# Altium footprint library PcbLib1.PcbLib: 81 footprints (part 2 of 6)
Each footprint in its own frame and in the unit in brackets; x right, y up, seen from the top. Pads: shape width x height; smd on the part's side, far side on the other; paste and mask are expansions set on the pad; w line width, h text height; cw(c..) or ccw(c..) is an arc to the next point about the centre after c.
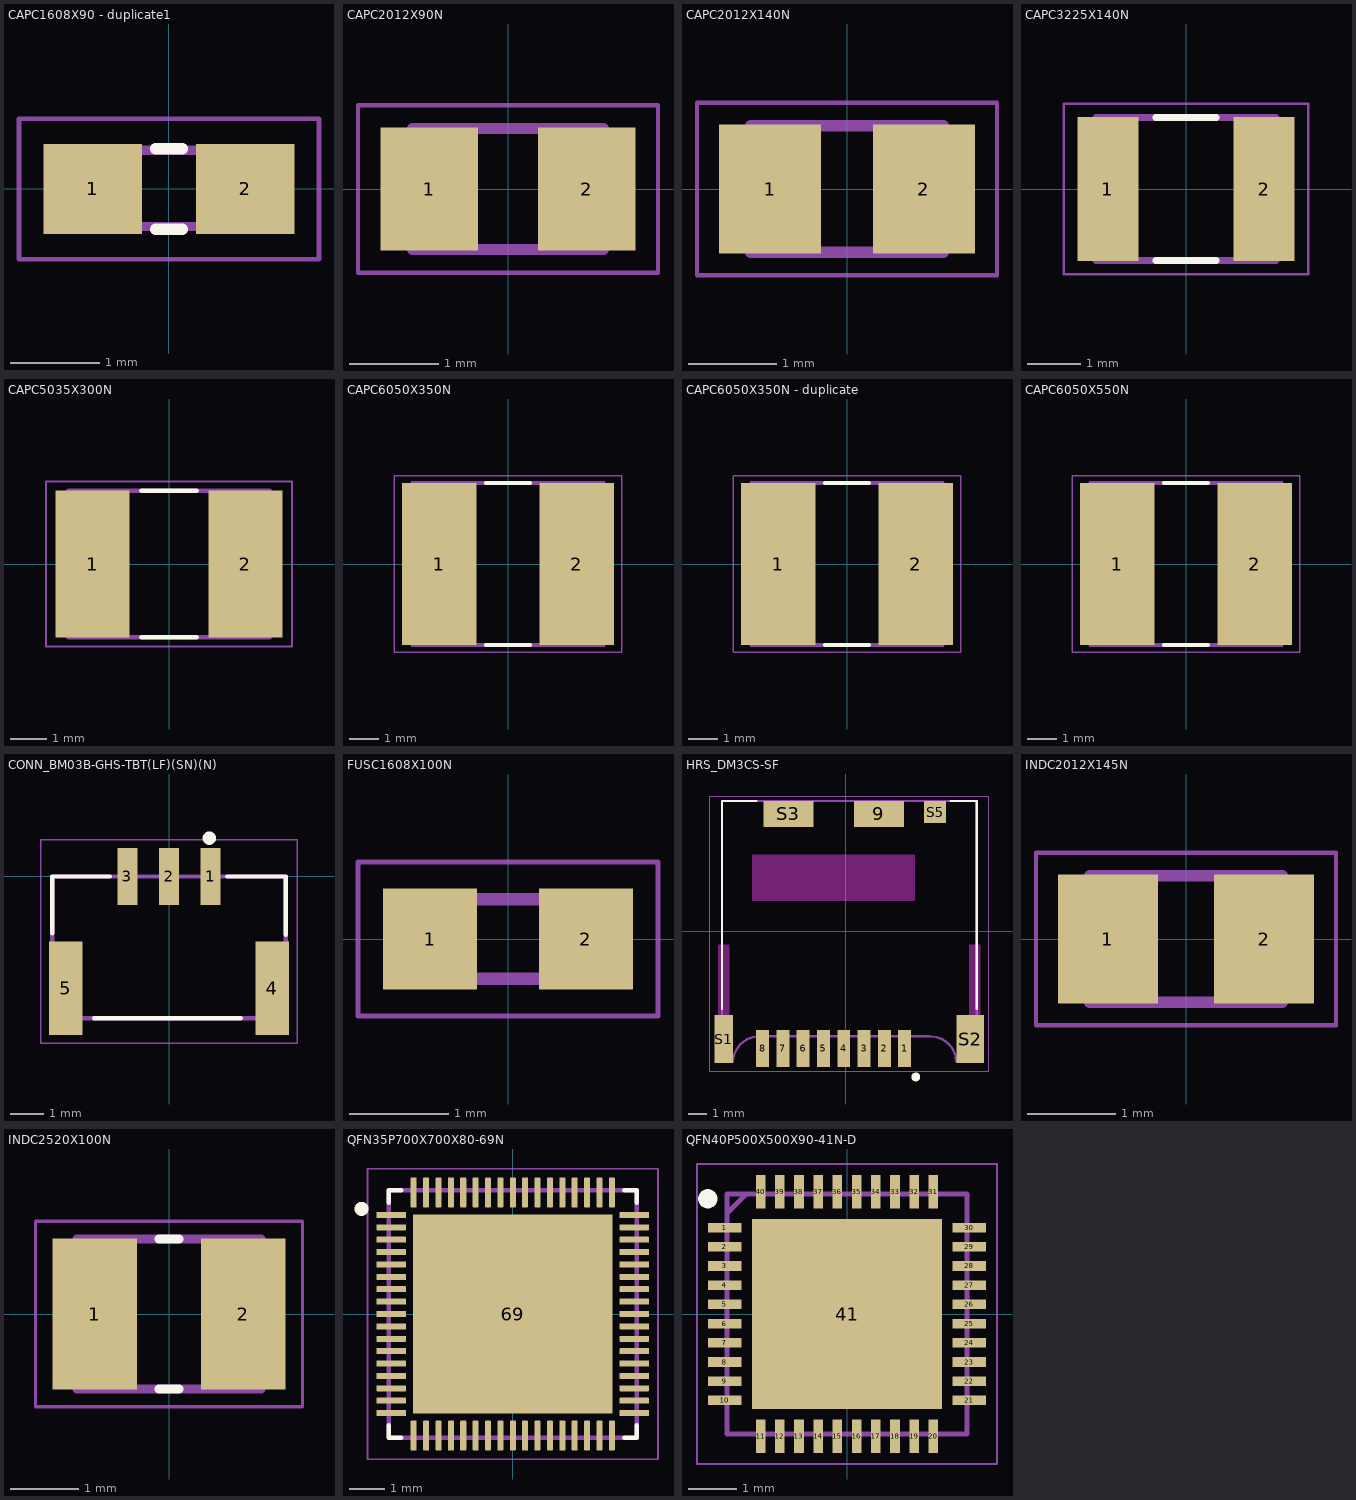
[diagram p1: the footprints below, top view; thin cyan lines are the x and y axes]

## CAPC1608X90 - duplicate1 [mm]
pads (2):
  rect 1.1x1 smd paste+0 mask+0.102: 1(-0.85,0) 2(0.85,0)
Top Overlay:
  lines w0.127: -0.15,-0.45 0.15,-0.45 ; -0.15,0.45 0.15,0.45
Mechanical 13:
  region: 0.83,-0.471 0.331,-0.471 0.331,0.48 0.83,0.48
  region: -0.338,-0.47 -0.839,-0.47 -0.839,0.48 -0.338,0.48
  lines w0.102: -0.356,-0.419 0.356,-0.419 ; -0.356,0.432 0.356,0.432
Mechanical 15:
  lines w0.051: -1.673,-0.783 -1.673,0.783 1.673,0.783 1.673,-0.783 -1.673,-0.783
3D body "step_temp.STEP": height 0.9, standoff 0, extent -0.8,-0.4 0.8,0.4

## CAPC2012X90N [mm]
pads (2):
  rect 1.1x1.38 smd: 1(-0.885,0) 2(0.885,0)
Mechanical 13:
  lines w0.127: -1.07,-0.68 -1.07,0.68 1.07,0.68 1.07,-0.68 -1.07,-0.68
Mechanical 15:
  lines w0.05: -1.685,-0.94 -1.685,0.94 1.685,0.94 1.685,-0.94 -1.685,-0.94
3D body "step_temp.STEP": height 0.9, standoff 0, extent -1,-0.625 1,0.625

## CAPC2012X140N [mm]
pads (2):
  rect 1.16x1.47 smd: 1(-0.875,0) 2(0.875,0)
Mechanical 13:
  lines w0.127: -1.1,-0.72 -1.1,0.72 1.1,0.72 1.1,-0.72 -1.1,-0.72
Mechanical 15:
  lines w0.05: -1.708,-0.983 -1.708,0.983 1.708,0.983 1.708,-0.983 -1.708,-0.983
3D body "step_temp.STEP": height 1.4, standoff 0, extent -1.016,-0.635 1.016,0.635

## CAPC3225X140N [mm]
pads (2):
  rect 1.16x2.72 smd: 1(-1.475,0) 2(1.475,0)
Top Overlay:
  lines w0.127: -0.57,-1.35 0.57,-1.35 ; -0.57,1.35 0.57,1.35
Mechanical 13:
  lines w0.127: -1.7,-1.35 1.7,-1.35 1.7,1.35 -1.7,1.35 -1.7,-1.35
Mechanical 15:
  lines w0.05: -2.308,-1.608 2.308,-1.608 2.308,1.608 -2.308,1.608 -2.308,-1.608
3D body "step_temp.STEP": height 1.45, standoff 0, extent -1.6,-1.25 1.6,1.25

## CAPC5035X300N [mm]
pads (2):
  rect 2.03x4.01 smd: 1(-2.086,0) 2(2.086,0)
Top Overlay:
  lines w0.127: -0.75,-2 0.75,-2 ; -0.75,2 0.75,2
Mechanical 13:
  lines w0.127: -2.75,-2 -2.75,2 2.75,2 2.75,-2 -2.75,-2
Mechanical 15:
  lines w0.05: -3.353,-2.253 -3.353,2.253 3.353,2.253 3.353,-2.253 -3.353,-2.253
3D body "step_temp.STEP": height 3, standoff 0, extent -2.5,-1.75 2.5,1.75

## CAPC6050X350N [mm]
pads (2):
  rect 2.53x5.51 smd: 1(-2.336,0) 2(2.336,0)
Top Overlay:
  lines w0.127: -0.75,-2.75 0.75,-2.75 ; -0.75,2.75 0.75,2.75
Mechanical 13:
  lines w0.127: -3.25,-2.75 3.25,-2.75 3.25,2.75 -3.25,2.75 -3.25,-2.75
Mechanical 15:
  lines w0.05: -3.853,-3.003 3.853,-3.003 3.853,3.003 -3.853,3.003 -3.853,-3.003
3D body "step_temp.STEP": height 3.5, standoff 0, extent -3,-2.5 3,2.5

## CAPC6050X350N - duplicate [mm]
pads (2):
  rect 2.53x5.51 smd: 1(-2.336,0) 2(2.336,0)
Top Overlay:
  lines w0.127: -0.75,-2.75 0.75,-2.75 ; -0.75,2.75 0.75,2.75
Mechanical 13:
  lines w0.127: -3.25,-2.75 -3.25,2.75 3.25,2.75 3.25,-2.75 -3.25,-2.75
Mechanical 15:
  lines w0.05: -3.853,-3.003 -3.853,3.003 3.853,3.003 3.853,-3.003 -3.853,-3.003
3D body "step_temp.STEP": height 3.5, standoff 0, extent -3,-2.5 3,2.5

## CAPC6050X550N [mm]
pads (2):
  rect 2.53x5.51 smd: 1(-2.336,0) 2(2.336,0)
Top Overlay:
  lines w0.127: -0.75,-2.75 0.75,-2.75 ; -0.75,2.75 0.75,2.75
Mechanical 13:
  lines w0.127: -3.25,-2.75 -3.25,2.75 3.25,2.75 3.25,-2.75 -3.25,-2.75
Mechanical 15:
  lines w0.05: -3.853,-3.003 -3.853,3.003 3.853,3.003 3.853,-3.003 -3.853,-3.003
3D body "step_temp.STEP": height 5.5, standoff 0, extent -3,-2.5 3,2.5

## CONN_BM03B-GHS-TBT(LF)(SN)(N) [mm]
pads (5):
  rect 0.6x1.7 smd: 1(1.25,0) 2(0,0) 3(-1.25,0)
  rect 1x2.8 smd: 4(3.1,-3.35) 5(-3.1,-3.35)
Top Overlay:
  circle w0.2: c1.21,1.15 r0.1
  lines w0.127: -3.5,-1.7 -3.5,0 -1.778,0 ; -2.25,-4.25 2.15,-4.25 ; 1.75,0 3.5,0 3.5,-1.75
Mechanical 13:
  lines w0.127: -3.5,-4.25 -3.5,0 3.5,0 3.5,-4.25 -3.5,-4.25
Mechanical 15:
  lines w0.05: -3.85,-5 -3.85,1.1 3.85,1.1 3.85,-5 -3.85,-5
3D body "step_temp.STEP": height 4.05, standoff -0.15, extent -3.5,-4.411 3.5,0.539

## FUSC1608X100N [mm]
height 1
pads (2):
  rect 0.95x1.02 smd: 1(-0.785,0) 2(0.785,0)
Mechanical 13:
  lines w0.127: -0.8,-0.4 -0.8,0.4 0.8,0.4 0.8,-0.4 -0.8,-0.4
Mechanical 15:
  lines w0.05: -1.51,-0.775 -1.51,0.775 1.51,0.775 1.51,-0.775 -1.51,-0.775
3D body "step_temp.STEP": height 1, standoff 0, extent -0.8,-0.4 0.8,0.4

## HRS_DM3CS-SF [mm]
pads (13):
  rect 0.7x2 smd: 1(3.2,-6.35) 2(2.1,-6.35) 3(1,-6.35) 4(-0.1,-6.35) 5(-1.2,-6.35) 6(-2.3,-6.35) 7(-3.4,-6.35) 8(-4.5,-6.35)
  rect 2.7x1.4 smd: 9(1.8,6.35) S3(-3.1,6.35)
  rect 1x2.6 smd: S1(-6.6,-5.85)
  rect 1.5x2.6 smd: S2(6.75,-5.85)
  rect 1.2x1.2 smd: S5(4.85,6.45)
Top Overlay:
  circle w0.24: c3.8,-7.9 r0.12
  lines w0.127: -6.7,-4.2 -6.7,7.05 -4.826,7.05 ; 5.7,7.05 7.1,7.05 7.1,-4.2
Keep-Out Layer:
  region: 3.75,1.651 -5.053,1.651 -5.053,4.15 3.75,4.15
  region: -6.3,-4.558 -6.912,-4.558 -6.912,-0.75 -6.3,-0.75
  region: 7.3,-4.556 6.709,-4.556 6.709,-0.75 7.3,-0.75
Mechanical 13:
  lines w0.127: 4.5,-5.7 -4.6,-5.7 ccw(c-4.675,-7.125) -6.1,-7.05 -6.7,-7.05 -6.7,7.05 7.1,7.05 7.1,-7.05 6,-7.05 ccw(c4.575,-7.125) 4.5,-5.7
Mechanical 15:
  lines w0.05: -7.35,-7.6 -7.35,7.3 7.75,7.3 7.75,-7.6 -7.35,-7.6
3D body "step_temp.STEP": height 2.13, standoff 0, extent -6.9,-7.05 6.9,7.05

## INDC2012X145N [mm]
pads (2):
  rect 1.14x1.47 smd paste+0 mask+0.102: 1(-0.89,0) 2(0.89,0)
Mechanical 13:
  lines w0.127: -1.1,-0.72 -1.1,0.72 1.1,0.72 1.1,-0.72 -1.1,-0.72
Mechanical 15:
  lines w0.05: -1.708,-0.983 -1.708,0.983 1.708,0.983 1.708,-0.983 -1.708,-0.983
3D body "step_temp.STEP": height 1.45, standoff 0, extent -1,-0.625 1,0.625

## INDC2520X100N [mm]
pads (2):
  rect 1.24x2.22 smd: 1(-1.09,0) 2(1.09,0)
Top Overlay:
  lines w0.127: -0.15,-1.1 0.15,-1.1 ; -0.15,1.1 0.15,1.1
Mechanical 13:
  lines w0.127: -1.35,-1.1 1.35,-1.1 1.35,1.1 -1.35,1.1 -1.35,-1.1
Mechanical 15:
  lines w0.05: -1.958,-1.358 1.958,-1.358 1.958,1.358 -1.958,1.358 -1.958,-1.358
3D body "DFE252010P-R47M=P2.STEP": height 1, standoff 0, extent -1.25,-1 1.25,1

## PCBComponent_1 [mm]

## QFN35P700X700X80-69N [mm]
pads (69):
  rrect25% 0.84x0.17 smd: 1(-3.435,2.8) 2(-3.435,2.45) 3(-3.435,2.1) 4(-3.435,1.75) 5(-3.435,1.4) 6(-3.435,1.05) 7(-3.435,0.7) 8(-3.435,0.35) 9(-3.435,0) 10(-3.435,-0.35) 11(-3.435,-0.7) 12(-3.435,-1.05) 13(-3.435,-1.4) 14(-3.435,-1.75) 15(-3.435,-2.1) 16(-3.435,-2.45) 17(-3.435,-2.8) 35(3.435,-2.8) 36(3.435,-2.45) 37(3.435,-2.1) 38(3.435,-1.75) 39(3.435,-1.4) 40(3.435,-1.05) 41(3.435,-0.7) 42(3.435,-0.35) 43(3.435,0) 44(3.435,0.35) 45(3.435,0.7) 46(3.435,1.05) 47(3.435,1.4) 48(3.435,1.75) 49(3.435,2.1) 50(3.435,2.45) 51(3.435,2.8)
  rrect25% 0.17x0.84 smd: 18(-2.8,-3.435) 19(-2.45,-3.435) 20(-2.1,-3.435) 21(-1.75,-3.435) 22(-1.4,-3.435) 23(-1.05,-3.435) 24(-0.7,-3.435) 25(-0.35,-3.435) 26(0,-3.435) 27(0.35,-3.435) 28(0.7,-3.435) 29(1.05,-3.435) 30(1.4,-3.435) 31(1.75,-3.435) 32(2.1,-3.435) 33(2.45,-3.435) 34(2.8,-3.435) 52(2.8,3.435) 53(2.45,3.435) 54(2.1,3.435) 55(1.75,3.435) 56(1.4,3.435) 57(1.05,3.435) 58(0.7,3.435) 59(0.35,3.435) 60(0,3.435) 61(-0.35,3.435) 62(-0.7,3.435) 63(-1.05,3.435) 64(-1.4,3.435) 65(-1.75,3.435) 66(-2.1,3.435) 67(-2.45,3.435) 68(-2.8,3.435)
  rect 5.63x5.63 smd paste-1.406: 69(0,0)
Top Overlay:
  circle w0.2: c-4.275,2.97 r0.1
  lines w0.127: -3.5,-3.15 -3.5,-3.5 -3.15,-3.5 ; -3.5,3.15 -3.5,3.5 -3.15,3.5 ; 3.15,-3.5 3.5,-3.5 3.5,-3.15 ; 3.15,3.5 3.5,3.5 3.5,3.15
Mechanical 13:
  lines w0.127: -3.5,-3.5 -3.5,3.5 3.5,3.5 3.5,-3.5 -3.5,-3.5
Mechanical 15:
  lines w0.05: -4.105,-4.105 -4.105,4.105 4.105,4.105 4.105,-4.105 -4.105,-4.105
3D body "step_temp.STEP": height 0.8, standoff 0, extent -3.5,-3.5 3.5,3.5

## QFN40P500X500X90-41N-D [mm]
pads (41):
  rect 0.7x0.2 smd: 1(-2.55,1.8) 2(-2.55,1.4) 3(-2.55,1) 4(-2.55,0.6) 5(-2.55,0.2) 6(-2.55,-0.2) 7(-2.55,-0.6) 8(-2.55,-1) 9(-2.55,-1.4) 10(-2.55,-1.8) 21(2.55,-1.8) 22(2.55,-1.4) 23(2.55,-1) 24(2.55,-0.6) 25(2.55,-0.2) 26(2.55,0.2) 27(2.55,0.6) 28(2.55,1) 29(2.55,1.4) 30(2.55,1.8)
  rect 0.2x0.7 smd: 11(-1.8,-2.55) 12(-1.4,-2.55) 13(-1,-2.55) 14(-0.6,-2.55) 15(-0.2,-2.55) 16(0.2,-2.55) 17(0.6,-2.55) 18(1,-2.55) 19(1.4,-2.55) 20(1.8,-2.55) 31(1.8,2.55) 32(1.4,2.55) 33(1,2.55) 34(0.6,2.55) 35(0.2,2.55) 36(-0.2,2.55) 37(-0.6,2.55) 38(-1,2.55) 39(-1.4,2.55) 40(-1.8,2.55)
  rect 3.95x3.95 smd: 41(0,0)
Top Overlay:
  circle w0.2: c-2.9,2.4 r0.1
Mechanical 15:
  lines w0.1: -2.5,2.1 -2.1,2.5 ; -2.5,-2.5 2.5,-2.5 2.5,2.5 -2.5,2.5 -2.5,-2.5
Mechanical 20:
  lines w0.05: -3.125,-3.125 3.125,-3.125 3.125,3.125 -3.125,3.125 -3.125,-3.125
3D body "ALC5651-CGT.stp": height 0.9, standoff 0, extent -2.55,-2.55 2.55,2.55